# Altium footprint library alex_footprint.PcbLib: 262 footprints (part 13 of 17)
Each footprint in its own frame and in the unit in brackets; x right, y up, seen from the top. Pads: shape width x height; smd on the part's side, far side on the other; paste and mask are expansions set on the pad; w line width, h text height; cw(c..) or ccw(c..) is an arc to the next point about the centre after c.
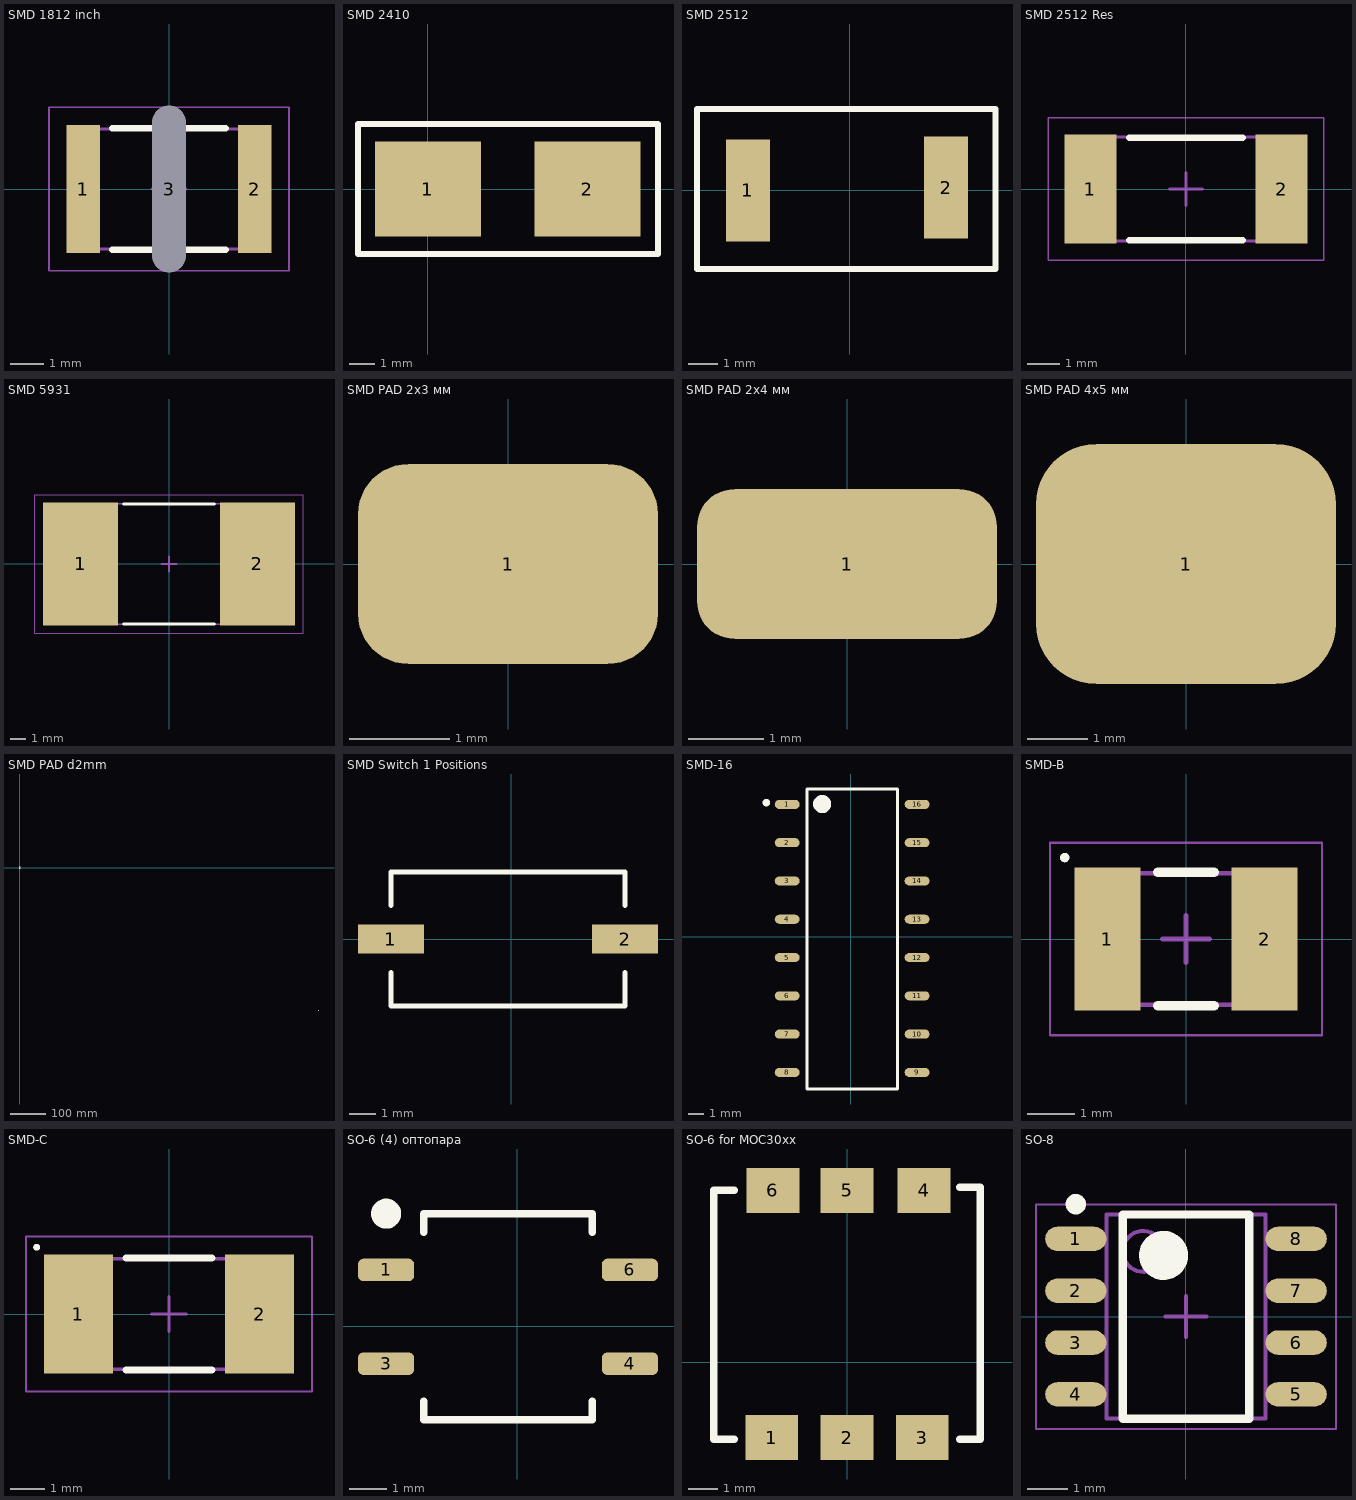
[diagram p12: the footprints below, top view; thin cyan lines are the x and y axes]

## SMD 1812 inch [mm]
height 2.9
pads (3):
  rect 1x3.85 smd: 1(-2.575,0) 2(2.575,0)
  oval 1x5 hole 1 slot 5 at 90 deg unplated mask+0: 3(0,0)
Top Overlay:
  lines w0.2: -1.7,-1.825 1.7,-1.825 ; -1.7,1.825 1.7,1.825
Mechanical 13:
  lines w0.1: -2.45,-1.8 2.45,-1.8 2.45,1.8 -2.45,1.8 -2.45,-1.8
Mechanical 15:
  lines w0.05: -3.6,-2.45 3.6,-2.45 3.6,2.45 -3.6,2.45 -3.6,-2.45
  lines w0.1: -0.5,0 0.5,0 ; 0,-0.5 0,0.5
3D body: height 2.9, standoff 0, extent 2.15,-1.8 2.45,1.8
3D body: height 2.9, standoff 0, extent -2.45,-1.8 -2.15,1.8
3D body: height 2.9, standoff 0, extent -2.15,-1.8 2.15,1.8

## SMD 2410 [mm]
height 3.8
pads (2):
  rect 4.24x3.81 smd: 1(0,0) 2(6.37,0)
Top Overlay:
  lines w0.254: -2.8,-2.6 -2.8,2.6 9.2,2.6 9.2,-2.6 -2.8,-2.6

## SMD 2512 [mm]
pads (2):
  rect 1.5x3.5 smd: 1(-3.5,0) 2(3.3,0.1)
Top Overlay:
  lines w0.2: -5.25,-2.7 5,-2.7 5,2.8 -5.25,2.8 -5.25,0 -5.25,-2.7

## SMD 2512 Res [mm]
height 0.55
pads (2):
  rect 1.6x3.35 smd: 1(-2.95,0) 2(2.95,0)
Top Overlay:
  lines w0.2: -1.75,-1.575 1.75,-1.575 ; -1.75,1.575 1.75,1.575
Mechanical 13:
  lines w0.1: -3.175,-1.6 -3.175,1.6 3.175,1.6 3.175,-1.6 -3.175,-1.6
Mechanical 15:
  lines w0.05: -4.25,-2.2 -4.25,2.2 4.25,2.2 4.25,-2.2 -4.25,-2.2
  lines w0.1: -0.5,0 0.5,0 ; 0,-0.5 0,0.5
3D body: height 0.55, standoff 0, extent -2.175,-1.6 2.175,1.6
3D body: height 0.55, standoff 0, extent -3.175,-1.6 -2.175,1.6
3D body: height 0.55, standoff 0, extent 2.175,-1.6 3.175,1.6

## SMD 5931 [mm] "Chip Resistor, 2-Leads, Body 15,00x7,75mm, IPC Low Density"
height 0.5
pads (2):
  rect 4.8x7.9 smd: 1(-5.675,0) 2(5.675,0)
Top Overlay:
  lines w0.2: -2.9,-3.85 2.9,-3.85 ; -2.9,3.85 2.9,3.85
Mechanical 13:
  lines w0.1: -7.5,-3.875 -7.5,3.875 7.5,3.875 7.5,-3.875 -7.5,-3.875
Mechanical 15:
  lines w0.05: -8.6,-4.45 -8.6,4.45 8.6,4.45 8.6,-4.45 -8.6,-4.45
  lines w0.1: -0.5,0 0.5,0 ; 0,-0.5 0,0.5
3D body: height 0.5, standoff 0, extent -3.3,-3.875 3.3,3.875
3D body: height 0.5, standoff 0, extent -7.5,-3.875 -3.3,3.875
3D body: height 0.5, standoff 0, extent 3.3,-3.875 7.5,3.875

## SMD PAD 2х3 мм [mm]
pads (1):
  rrect50% 3x2 smd mask+0.25: 1(0,0)

## SMD PAD 2х4 мм [mm]
pads (1):
  rrect50% 4x2 smd mask+0.25: 1(0,0)

## SMD PAD 4х5 мм [mm]
pads (1):
  rrect50% 5x4 smd mask+0.25: 1(0,0)

## SMD PAD d2mm [mm]
pads (2):
  round 2 smd mask+0.25: 1(0,0) 14(837.8,-400.2)
Top Overlay:
  circle w0.25: c0,0 r1.456

## SMD Switch 1 Positions [mm]
pads (2):
  rect 2.5x1.1 smd mask+0.25: 1(-4.56,0) 2(4.33,0)
Top Overlay:
  lines w0.2: -4.56,-1.27 -4.56,-2.54 4.33,-2.54 4.33,-1.27 ; -4.56,1.27 -4.56,2.54 4.33,2.54 4.33,1.27
Mechanical 7:
  text ".Designator" at 0.8,2.5 h1.5

## SMD-16 [mm]
height 1.75
pads (16):
  oval 1.65x0.6 smd: 1(-4.22,8.78) 2(-4.22,6.24) 3(-4.22,3.7) 4(-4.22,1.16) 5(-4.22,-1.38) 6(-4.22,-3.92) 7(-4.22,-6.46) 8(-4.22,-9) 9(4.4,-9) 10(4.4,-6.46) 11(4.4,-3.92) 12(4.4,-1.38) 13(4.4,1.16) 14(4.4,3.7) 15(4.4,6.24) 16(4.4,8.78)
Top Overlay:
  circle w0.6: c-1.9,8.8 r0.3
  circle w0.25: c-5.6,8.9 r0.125
  lines w0.2: -2.9,-10.1 3.1,-10.1 3.1,9.8 -2.9,9.8 -2.9,-10.1

## SMD-B [mm]
height 1.9
pads (2):
  rect 1.4x3.05 smd: 1(-1.675,0) 2(1.675,0)
Top Overlay:
  circle w0.1: c-2.587,1.737 r0.05
  lines w0.2: -0.6,-1.425 0.6,-1.425 ; -0.6,1.425 0.6,1.425
Mechanical 13:
  lines w0.1: -1.75,-1.4 -1.75,1.4 1.75,1.4 1.75,-1.4 -1.75,-1.4
Mechanical 15:
  lines w0.05: -2.9,-2.05 -2.9,2.05 2.9,2.05 2.9,-2.05 -2.9,-2.05
  lines w0.1: -0.5,0 0.5,0 ; 0,-0.5 0,0.5
3D body: height 1.9, standoff 0, extent -1.05,-1.4 1.05,1.4
3D body: height 1.9, standoff 0, extent -1.75,-1.4 -1.05,1.4
3D body: height 1.9, standoff 0, extent 1.05,-1.4 1.75,1.4

## SMD-C [mm]
height 2.5
pads (2):
  rect 2x3.45 smd: 1(-2.625,0) 2(2.625,0)
Top Overlay:
  circle w0.1: c-3.837,1.937 r0.05
  lines w0.2: -1.25,-1.625 1.25,-1.625 ; -1.25,1.625 1.25,1.625
Mechanical 13:
  lines w0.1: -3,-1.6 3,-1.6 3,1.6 -3,1.6 -3,-1.6
Mechanical 15:
  lines w0.05: -4.15,-2.25 4.15,-2.25 4.15,2.25 -4.15,2.25 -4.15,-2.25
  lines w0.1: -0.5,0 0.5,0 ; 0,-0.5 0,0.5
3D body: height 2.5, standoff 0, extent 1.7,-1.6 3,1.6
3D body: height 2.5, standoff 0, extent -3,-1.6 -1.7,1.6
3D body: height 2.5, standoff 0, extent -1.7,-1.6 1.7,1.6

## SO-6 (4) оптопара [mm]
pads (4):
  rrect50% 1.5x0.6 smd mask+0.25: 1(-3.5,1.5) 3(-3.5,-1) 4(3,-1) 6(3,1.5)
Top Overlay:
  circle w0.5: c-3.5,3 r0.15
  lines w0.2: -2.5,-2 -2.5,-2.5 2,-2.5 2,-2 ; -2.5,2.5 -2.5,3 2,3 2,2.5

## SO-6 for MOC30xx [mm]
height 10
pads (6):
  rect 1.78x1.52 smd: 1(-2.54,-2.54) 2(0,-2.54) 3(2.54,-2.54) 4(2.6,5.8) 5(0,5.8) 6(-2.5,5.8)
Top Overlay:
  lines w0.254: -3.8,-2.6 -4.5,-2.6 -4.5,5.8 -3.8,5.8 ; 3.8,-2.6 4.5,-2.6 4.5,5.9 3.8,5.9

## SO-8 [mm] "SOIC, 8-Leads, Body 4,95x3,90mm, Pitch 1,27mm, IPC Medium Density"
height 1.75
pads (8):
  oval 1.5x0.6 smd: 1(-2.7,1.905) 2(-2.7,0.635) 3(-2.7,-0.635) 4(-2.7,-1.905) 5(2.7,-1.905) 6(2.7,-0.635) 7(2.7,0.635) 8(2.7,1.905)
Top Overlay:
  circle w0.25: c-2.7,2.755 r0.125
  circle w0.6: c-0.55,1.5 r0.3
  lines w0.2: -1.55,-2.5 -1.55,2.5 1.55,2.5 1.55,-2.5 -1.55,-2.5
Mechanical 13:
  circle w0.1: c-1.05,1.6 r0.5
  lines w0.1: -1.95,-2.5 -1.95,2.5 1.95,2.5 1.95,-2.5 -1.95,-2.5
Mechanical 15:
  lines w0.05: -3.675,-2.75 -3.675,2.75 3.675,2.75 3.675,-2.75 -3.675,-2.75
  lines w0.1: -0.5,0 0.5,0 ; 0,-0.5 0,0.5
3D body: height 1.75, standoff 0.1, extent -1.75,-2.5 2.15,2.5